# Altium footprint library ZJUDancer_Circuit_V4.1.PcbLib: 96 footprints (part 4 of 6)
Each footprint in its own frame and in the unit in brackets; x right, y up, seen from the top. Pads: shape width x height; smd on the part's side, far side on the other; paste and mask are expansions set on the pad; w line width, h text height; cw(c..) or ccw(c..) is an arc to the next point about the centre after c.
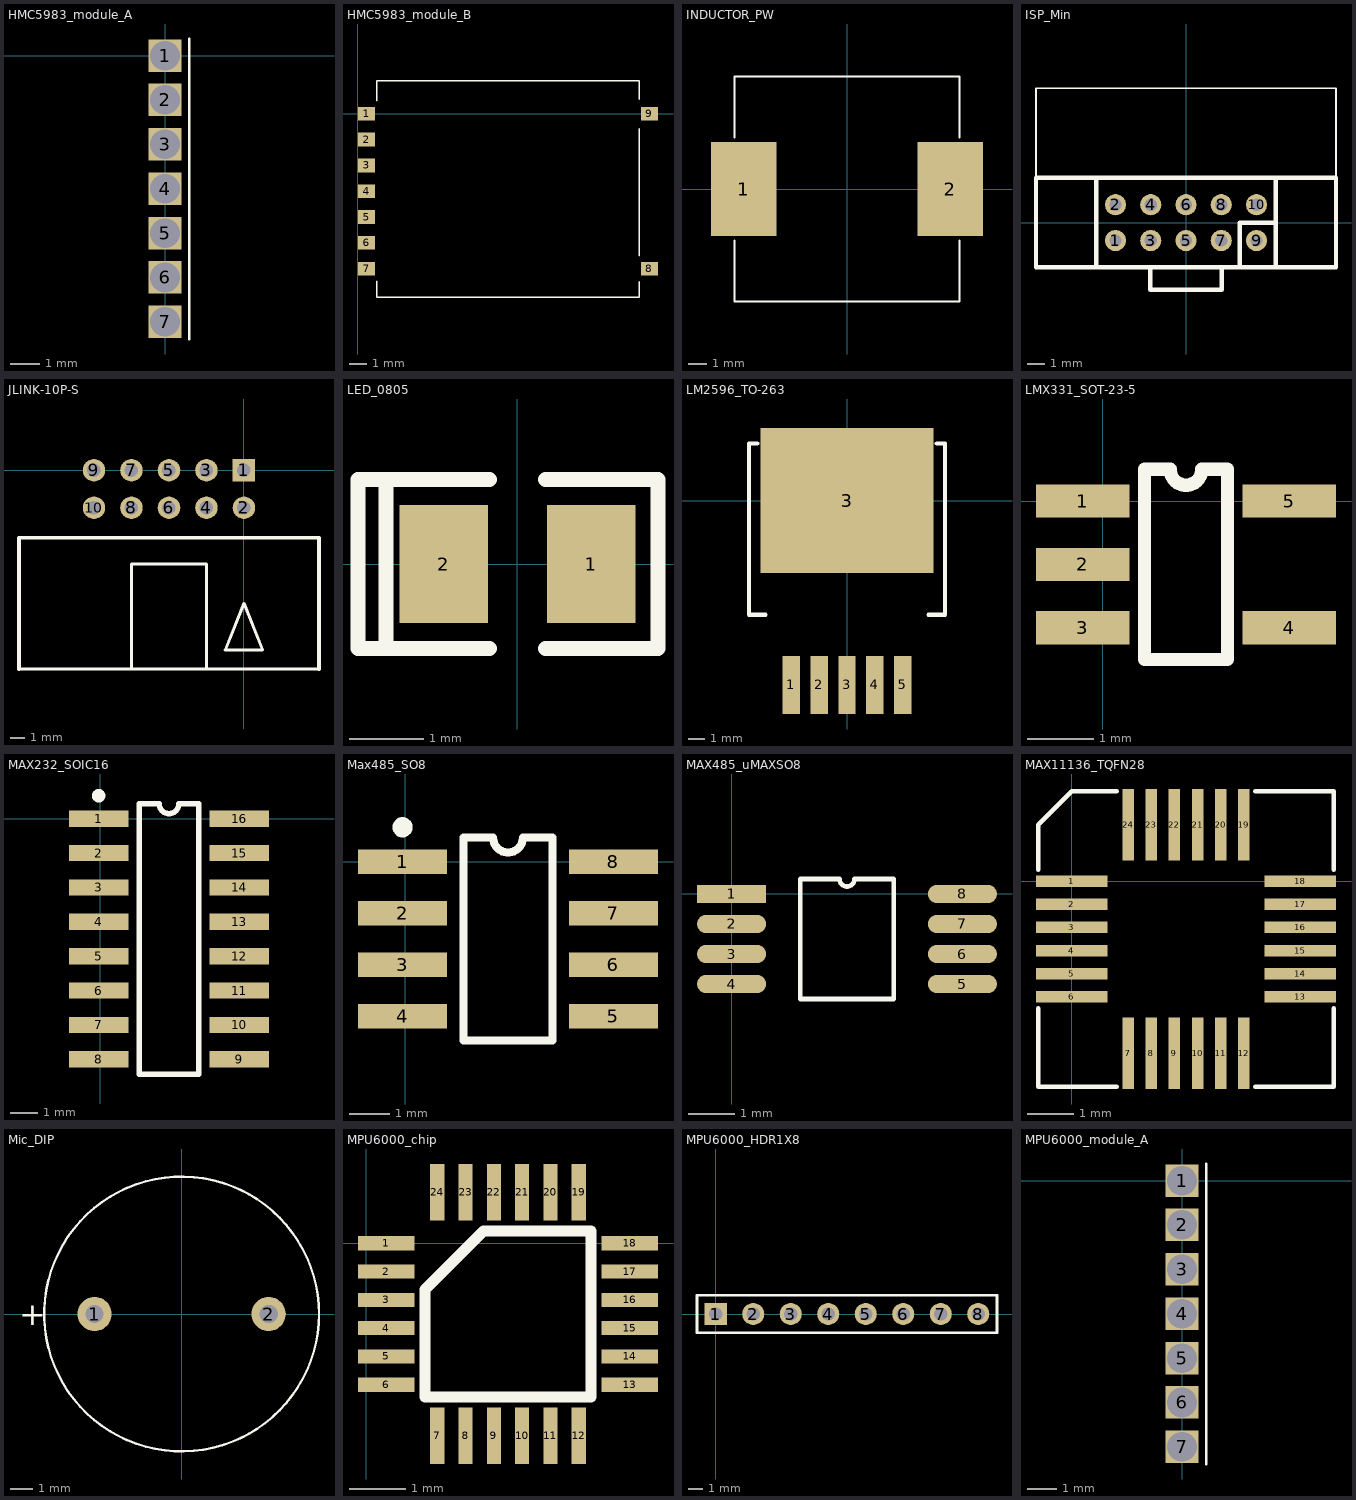
[diagram p3: the footprints below, top view; thin cyan lines are the x and y axes]

## HMC5983_module_A [mm]
pads (7):
  rect 1.1x1.1 hole 1: 1(0,0) 2(0,-1.5) 3(0,-3) 4(0,-4.5) 5(0,-6) 6(0,-7.5) 7(0,-9)
Top Overlay:
  lines w0.1: 0.82,-9.58 0.82,0.56

## HMC5983_module_B [mm]
pads (9):
  rect 1x0.8 smd: 1(0.5,0) 2(0.5,-1.5) 3(0.5,-3) 4(0.5,-4.5) 5(0.5,-6) 6(0.5,-7.5) 7(0.5,-9) 8(16.929,-9) 9(16.929,0)
Top Overlay:
  lines w0.1: 1.092,-9.746 1.092,-10.658 16.332,-10.658 16.332,-9.76 ; 1.092,0.773 1.092,1.915 16.332,1.915 16.332,0.84 ; 16.332,-8.237 16.332,-0.872
3D body: height 2.24, standoff 0.02, extent 1.092,-10.658 16.332,1.915

## INDUCTOR_PW [mm]
height 1
pads (2):
  rect 3.5x5 smd: 1(-5.5,0) 2(5.5,0)
Top Overlay:
  lines w0.127: -6,-2.75 -6,-6 6,-6 6,-2.75 ; -6,2.75 -6,6 6,6 6,2.75
3D body: height 7.52, standoff 0.02, extent -6,-6 6,6

## ISP_Min [mm]
pads (10):
  round 1.2 hole 0.7: 1(-4,-1.016) 2(-4,1.016) 3(-2,-1.016) 4(-2,1.016) 5(0,-1.016) 6(0,1.016) 7(2,-1.016) 8(2,1.016) 9(4,-1.016) 10(4,1.016)
Top Overlay:
  lines w0.1: -8.509,2.54 -8.509,7.625 8.509,7.625 8.509,2.54
  lines w0.254: -5.08,-2.54 -5.08,2.54 ; -2.032,-2.54 -2.032,-3.81 2.032,-3.81 2.032,-2.54 ; 3.048,-2.54 3.048,0 5.08,0 ; 5.08,-2.54 5.08,2.54 ; -8.509,-2.54 8.509,-2.54 8.509,2.54 -8.509,2.54 -8.509,-2.54
3D body: height 5.42, standoff -2.68, extent -8.605,-1.223 8.595,7.627

## JLINK-10P-S [mil]
pads (10):
  rect 60x60 hole 36: 1(0,0)
  round 60 hole 36: 2(0,-100) 3(-100,0) 4(-100,-100) 5(-200,0) 6(-200,-100) 7(-300,0) 8(-300,-100) 9(-400,0) 10(-400,-100)
Top Overlay:
  lines w8: -600,-530 -300,-530 ; 200,-530 -100,-530 ; -300,-530 -100,-530 ; -300,-530 -300,-250 -100,-250 -100,-530 ; -50,-480 50,-480 0,-355 -50,-480
  lines w10: -600,-530 -600,-180 200,-180 200,-530

## LED_0805 [mm] "LED_0805贴片"
pads (2):
  rect 1.2x1.6 smd: 1(1,0) 2(-1,0)
Top Overlay:
  lines w0.203: -1.778,-1.143 -1.778,1.143 ; -0.381,-1.143 -2.159,-1.143 -2.159,1.143 -0.381,1.143 ; 0.381,-1.143 1.905,-1.143 1.905,1.143 0.381,1.143
3D body: height 1.13, standoff 0.02, extent -1.045,-0.602 0.987,0.667

## LM2596_TO-263 [mil]
pads (6):
  rect 42x140 smd: 1(-134,-444.8) 2(-67,-444.8) 3(0,-444.8) 4(67,-444.8) 5(134,-444.8)
  rect 417.32x350 smd: 3(0,0)
Top Overlay:
  lines w10: -216.54,137.8 -236.22,137.8 -236.22,-275.59 -196.85,-275.59 ; 196.85,-275.59 236.22,-275.59 236.22,137.8 216.54,137.8
3D body: height 173.87, standoff 0.6, extent -198.82,-480.31 198.82,137.79

## LMX331_SOT-23-5 [mm]
pads (5):
  rect 1.4x0.5 smd: 1(-0.3,0) 2(-0.3,-0.95) 3(-0.3,-1.9) 4(2.8,-1.9) 5(2.8,0)
Top Overlay:
  lines w0.2: 0.627,-2.375 1.873,-2.375 1.873,0.475 1.488,0.475 cw(c1.25,0.475) 1.013,0.475 0.627,0.475 0.627,-2.375
3D body: height 1.2, standoff 0, extent -0.15,-2.4 2.65,0.5

## MAX232_SOIC16 [mm]
pads (16):
  rect 2.2x0.6 smd: 1(-0.06,0) 2(-0.06,-1.27) 3(-0.06,-2.54) 4(-0.06,-3.81) 5(-0.06,-5.08) 6(-0.06,-6.35) 7(-0.06,-7.62) 8(-0.06,-8.89) 9(5.14,-8.89) 10(5.14,-7.62) 11(5.14,-6.35) 12(5.14,-5.08) 13(5.14,-3.81) 14(5.14,-2.54) 15(5.14,-1.27) 16(5.14,0)
Top Overlay:
  circle w0.25: c-0.06,0.85 r0.125
  lines w0.2: 1.44,-9.445 3.64,-9.445 3.64,0.555 2.907,0.555 cw(c2.54,0.555) 2.173,0.555 1.44,0.555 1.44,-9.445
3D body: height 1.64, standoff -0.01, extent -0.449,-9.396 5.551,0.504

## Max485_SO8 [mm]
pads (8):
  rect 2.2x0.6 smd: 1(-0.06,0) 2(-0.06,-1.27) 3(-0.06,-2.54) 4(-0.06,-3.81) 5(5.14,-3.81) 6(5.14,-2.54) 7(5.14,-1.27) 8(5.14,0)
Top Overlay:
  circle w0.25: c-0.06,0.85 r0.125
  lines w0.2: 1.44,-4.405 1.44,0.595 2.173,0.595 ccw(c2.54,0.595) 2.907,0.595 3.64,0.595 3.64,-4.405 1.44,-4.405

## MAX485_uMAXSO8 [mm]
pads (8):
  rect 1.5x0.4 smd: 1(0,0)
  oval 1.5x0.4 smd: 2(0,-0.65) 3(0,-1.3) 4(0,-1.95) 5(5,-1.95) 6(5,-1.3) 7(5,-0.65) 8(5,0)
Top Overlay:
  lines w0.1: 1.485,-2.275 1.485,0.325 2.338,0.325 ccw(c2.5,0.325) 2.662,0.325 3.515,0.325 3.515,-2.275 1.485,-2.275
3D body: height 0.98, standoff -0.02, extent 0,-2.475 5,0.525

## MAX11136_TQFN28 [mm]
pads (24):
  rect 1.55x0.25 smd: 1(0,0) 2(0,-0.5) 3(0,-1) 4(0,-1.5) 5(0,-2) 6(0,-2.5) 13(4.95,-2.5) 14(4.95,-2) 15(4.95,-1.5) 16(4.95,-1) 17(4.95,-0.5) 18(4.95,0)
  rect 0.25x1.55 smd: 7(1.225,-3.725) 8(1.725,-3.725) 9(2.225,-3.725) 10(2.725,-3.725) 11(3.225,-3.725) 12(3.725,-3.725) 19(3.725,1.225) 20(3.225,1.225) 21(2.725,1.225) 22(2.225,1.225) 23(1.725,1.225) 24(1.225,1.225)
Top Overlay:
  lines w0.1: -0.725,-2.75 -0.725,-4.45 0.975,-4.45 ; -0.725,0.25 -0.725,1.225 0,1.95 0.975,1.95 ; 3.975,-4.45 5.675,-4.45 5.675,-2.75 ; 3.975,1.95 5.675,1.95 5.675,0.25

## Mic_DIP [mm]
pads (2):
  round 1.5 hole 0.8: 1(-3.8,0) 2(3.8,0)
Top Overlay:
  circle w0.1: c0,0 r6
  text "+" at -7.1,-0.5 h1.02

## MPU6000_chip [mm]
pads (24):
  rect 1x0.25 smd: 1(0.35,0) 2(0.35,-0.5) 3(0.35,-1) 4(0.35,-1.5) 5(0.35,-2) 6(0.35,-2.5) 13(4.65,-2.5) 14(4.65,-2) 15(4.65,-1.5) 16(4.65,-1) 17(4.65,-0.5) 18(4.65,0)
  rect 0.25x1 smd: 7(1.25,-3.4) 8(1.75,-3.4) 9(2.25,-3.4) 10(2.75,-3.4) 11(3.25,-3.4) 12(3.75,-3.4) 19(3.75,0.9) 20(3.25,0.9) 21(2.75,0.9) 22(2.25,0.9) 23(1.75,0.9) 24(1.25,0.9)
Top Overlay:
  lines w0.2: 1.035,-2.715 1.035,-0.82 2.07,0.215 3.965,0.215 3.965,-2.715 1.035,-2.715

## MPU6000_HDR1X8 [mm] "Connector; Header; 8 Position"
pads (8):
  rect 1.5x1.5 hole 0.9: 1(0,0)
  round 1.5 hole 0.9: 2(2.54,0) 3(5.08,0) 4(7.62,0) 5(10.16,0) 6(12.7,0) 7(15.24,0) 8(17.78,0)
Top Overlay:
  lines w0.2: -1.27,-1.27 19.05,-1.27 19.05,1.27 -1.27,1.27 -1.27,-1.27
3D body: height 12.66, standoff -2.58, extent -1.35,-14 19.15,1.5

## MPU6000_module_A [mm]
pads (7):
  rect 1.1x1.1 hole 1: 1(0,0) 2(0,-1.5) 3(0,-3) 4(0,-4.5) 5(0,-6) 6(0,-7.5) 7(0,-9)
Top Overlay:
  lines w0.1: 0.82,-9.58 0.82,0.56